# Altium schematic symbol library Semi-ATE.SchLib: 322 symbols (part 2 of 6)
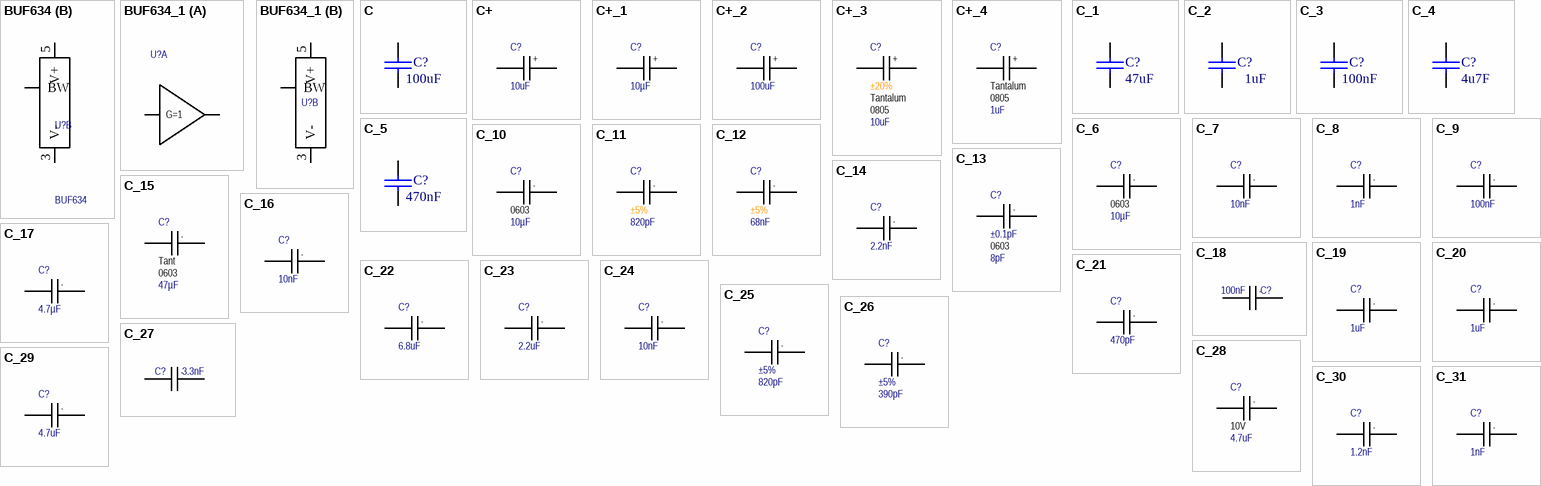
[diagram p20: symbols BUF634 to C_31]

## C_20
designator C?, comment value 1uF  (hidden comment: C)
CAP CER 1UF 16V X5R 0402; 04. Manufacturer: Samsung Electro-Mechanics; 07. Manufacturer  Part Number: CL05A105KO5NNNC; Tolerance: ±10%; 03. Unit Price: 0.09; 13. Created Date/Name: AUG2018/Hören; 3D-Export: No; Voltage Rating: 16V; Type: X5R; ComponentLink1Description: Info; ComponentLink1URL: https://www.digikey.de/product-detail/en/samsung-electro-mechanics/CL05A105KO5NNNC/1276-1067-6-ND/3891581; 02. Distributor Part Number: 1276-1067-6-ND; 09. Operating Temperature: -55°C ~ 85°C; 11. RoHS: YES; 01. Distributor: DigiKey; ComponentLink2Description: DataSheet; ComponentLink2URL: http://www.samsungsem.com/kr/support/product-search/mlcc/__icsFiles/afieldfile/2018/06/19/CL05A105KO5NNNC.pdf; Package: 0402
simulation model CAP (Capacitor)
signal-integrity model Cap
footprint C0201 Reflow (SMT Capacitor 0201 Reflow Soldering)
footprint C0402 Reflow (SMT CAP 0402 Reflow Soldering)
footprint C0603 Reflow (SMT Capacitor 0603 Reflow Soldering)
footprint C0603 Wave (SMT Capacitor 0603 Wave Soldering)
footprint C0805 Reflow (SMT Capacitor 0805 Reflow Soldering)
footprint C0805 Wave (SMT Capacitor 0805 Wave Soldering)
footprint Model Name (Footprint not found)
footprint Model Name (Footprint not found)
footprint C1206 Reflow (SMT Capacitor 1206 Reflow Soldering)
footprint C1206 Wave (SMT Capacitor 1206 Wave Soldering)
footprint C1210 Reflow (SMT Capacitor 1210 Reflow Soldering)
footprint C1210 Wave (SMT Capacitor 1210 Wave Soldering)
footprint C1632 Reflow (SMT Capacitor 1632 Reflow Soldering)
footprint C1632 Wave (SMT Capacitor 1632 Wave Soldering)
footprint C1808 Reflow (SMT Capacitor 1808 Reflow Soldering)
footprint C1808 Wave (SMT Capacitor 1808 Wave Soldering)
footprint C1825 Reflow (SMT Capacitor 1825 Reflow Soldering)
footprint C1825 Wave (SMT Capacitor 1825 Wave Soldering)
footprint C2220 Reflow (SMT Capacitor 2220 Reflow Soldering)
footprint C2220 Wave (SMT Capacitor 2220 Wave Soldering)
footprint C2225 Reflow (SMT Capacitor 2225 Reflow Soldering)
footprint C2225 Wave (SMT Capacitor 2225 Wave Soldering)
pins: 1, 2
text: .

## C_21
designator C?, comment value 470pF  (hidden comment: C)
CAP CER 470PF 16V X7R 0402; 04. Manufacturer: KEMET; 07. Manufacturer  Part Number: C0402C471K4RACTU; Tolerance: ±10%; 03. Unit Price: 0.41; 13. Created Date/Name: AUG2018/Hören; 3D-Export: No; Voltage Rating: 16V; Type: X7R; ComponentLink1Description: Info; ComponentLink1URL: https://www.digikey.de/product-detail/en/kemet/C0402C471K4RACTU/399-7799-6-ND/3472330; 02. Distributor Part Number: 399-7799-6-ND; 09. Operating Temperature: -55°C ~ 125°C; 11. RoHS: YES; 01. Distributor: DigiKey; ComponentLink2Description: DataSheet; Package: 0402
simulation model CAP (Capacitor)
signal-integrity model Cap
footprint C0201 Reflow (SMT Capacitor 0201 Reflow Soldering)
footprint C0402 Reflow (SMT CAP 0402 Reflow Soldering)
footprint C0603 Reflow (SMT Capacitor 0603 Reflow Soldering)
footprint C0603 Wave (SMT Capacitor 0603 Wave Soldering)
footprint C0805 Reflow (SMT Capacitor 0805 Reflow Soldering)
footprint C0805 Wave (SMT Capacitor 0805 Wave Soldering)
footprint Model Name (Footprint not found)
footprint Model Name (Footprint not found)
footprint C1206 Reflow (SMT Capacitor 1206 Reflow Soldering)
footprint C1206 Wave (SMT Capacitor 1206 Wave Soldering)
footprint C1210 Reflow (SMT Capacitor 1210 Reflow Soldering)
footprint C1210 Wave (SMT Capacitor 1210 Wave Soldering)
footprint C1632 Reflow (SMT Capacitor 1632 Reflow Soldering)
footprint C1632 Wave (SMT Capacitor 1632 Wave Soldering)
footprint C1808 Reflow (SMT Capacitor 1808 Reflow Soldering)
footprint C1808 Wave (SMT Capacitor 1808 Wave Soldering)
footprint C1825 Reflow (SMT Capacitor 1825 Reflow Soldering)
footprint C1825 Wave (SMT Capacitor 1825 Wave Soldering)
footprint C2220 Reflow (SMT Capacitor 2220 Reflow Soldering)
footprint C2220 Wave (SMT Capacitor 2220 Wave Soldering)
footprint C2225 Reflow (SMT Capacitor 2225 Reflow Soldering)
footprint C2225 Wave (SMT Capacitor 2225 Wave Soldering)
pins: 1, 2
text: .

## C_22
designator C?, comment value 6.8uF  (hidden comment: C)
CAP CER 6.8UF 25V X5R 0603; 04. Manufacturer: TDK Corporation; 07. Manufacturer  Part Number: C1608X5R1E685K080AC; Tolerance: ±10%; 03. Unit Price: 0.72; 13. Created Date/Name: AUG2018/Hören; 3D-Export: No; Voltage Rating: 25V; Type: X5R; ComponentLink1Description: Info; ComponentLink1URL: https://www.digikey.de/product-detail/en/tdk-corporation/C1608X5R1E685K080AC/445-14145-6-ND/3960241; 02. Distributor Part Number: 445-14145-6-ND; 09. Operating Temperature: -55°C ~ 85°C; 11. RoHS: YES; 01. Distributor: DigiKey; ComponentLink2Description: DataSheet; ComponentLink2URL: https://product.tdk.com/info/en/catalog/datasheets/mlcc_commercial_general_en.pdf; Package: 0603
simulation model CAP (Capacitor)
signal-integrity model Cap
footprint C0201 Reflow (SMT Capacitor 0201 Reflow Soldering)
footprint C0402 Reflow (SMT CAP 0402 Reflow Soldering)
footprint C0603 Reflow (SMT Capacitor 0603 Reflow Soldering)
footprint C0603 Wave (SMT Capacitor 0603 Wave Soldering)
footprint C0805 Reflow (SMT Capacitor 0805 Reflow Soldering)
footprint C0805 Wave (SMT Capacitor 0805 Wave Soldering)
footprint Model Name (Footprint not found)
footprint Model Name (Footprint not found)
footprint C1206 Reflow (SMT Capacitor 1206 Reflow Soldering)
footprint C1206 Wave (SMT Capacitor 1206 Wave Soldering)
footprint C1210 Reflow (SMT Capacitor 1210 Reflow Soldering)
footprint C1210 Wave (SMT Capacitor 1210 Wave Soldering)
footprint C1632 Reflow (SMT Capacitor 1632 Reflow Soldering)
footprint C1632 Wave (SMT Capacitor 1632 Wave Soldering)
footprint C1808 Reflow (SMT Capacitor 1808 Reflow Soldering)
footprint C1808 Wave (SMT Capacitor 1808 Wave Soldering)
footprint C1825 Reflow (SMT Capacitor 1825 Reflow Soldering)
footprint C1825 Wave (SMT Capacitor 1825 Wave Soldering)
footprint C2220 Reflow (SMT Capacitor 2220 Reflow Soldering)
footprint C2220 Wave (SMT Capacitor 2220 Wave Soldering)
footprint C2225 Reflow (SMT Capacitor 2225 Reflow Soldering)
footprint C2225 Wave (SMT Capacitor 2225 Wave Soldering)
pins: 1, 2
text: .

## C_23
designator C?, comment value 2.2uF  (hidden comment: C)
CAP CER 2.2UF 25V X5R 0402; 04. Manufacturer: TDK Corporation; 07. Manufacturer  Part Number: C1005X5R1E225K050BC; Tolerance: ±10%; 03. Unit Price: 0.35; 13. Created Date/Name: AUG2018/Hören; 3D-Export: No; Voltage Rating: 25V; Type: X5R; ComponentLink1Description: Info; ComponentLink1URL: https://www.digikey.de/product-detail/en/tdk-corporation/C1005X5R1E225K050BC/445-9090-6-ND/3661611; 02. Distributor Part Number: 445-9090-6-ND; 09. Operating Temperature: -55°C ~ 85°C; 11. RoHS: YES; 01. Distributor: DigiKey; ComponentLink2Description: DataSheet; ComponentLink2URL: https://product.tdk.com/info/en/catalog/datasheets/mlcc_commercial_general_en.pdf; Package: 0402
simulation model CAP (Capacitor)
signal-integrity model Cap
footprint C0201 Reflow (SMT Capacitor 0201 Reflow Soldering)
footprint C0402 Reflow (SMT CAP 0402 Reflow Soldering)
footprint C0603 Reflow (SMT Capacitor 0603 Reflow Soldering)
footprint C0603 Wave (SMT Capacitor 0603 Wave Soldering)
footprint C0805 Reflow (SMT Capacitor 0805 Reflow Soldering)
footprint C0805 Wave (SMT Capacitor 0805 Wave Soldering)
footprint Model Name (Footprint not found)
footprint Model Name (Footprint not found)
footprint C1206 Reflow (SMT Capacitor 1206 Reflow Soldering)
footprint C1206 Wave (SMT Capacitor 1206 Wave Soldering)
footprint C1210 Reflow (SMT Capacitor 1210 Reflow Soldering)
footprint C1210 Wave (SMT Capacitor 1210 Wave Soldering)
footprint C1632 Reflow (SMT Capacitor 1632 Reflow Soldering)
footprint C1632 Wave (SMT Capacitor 1632 Wave Soldering)
footprint C1808 Reflow (SMT Capacitor 1808 Reflow Soldering)
footprint C1808 Wave (SMT Capacitor 1808 Wave Soldering)
footprint C1825 Reflow (SMT Capacitor 1825 Reflow Soldering)
footprint C1825 Wave (SMT Capacitor 1825 Wave Soldering)
footprint C2220 Reflow (SMT Capacitor 2220 Reflow Soldering)
footprint C2220 Wave (SMT Capacitor 2220 Wave Soldering)
footprint C2225 Reflow (SMT Capacitor 2225 Reflow Soldering)
footprint C2225 Wave (SMT Capacitor 2225 Wave Soldering)
pins: 1, 2
text: .

## C_24
designator C?, comment value 10nF  (hidden comment: C)
CAP CER 10000PF 25V X7R 0402; 04. Manufacturer: 311-1337-6-ND; 07. Manufacturer  Part Number: CC0402KRX7R8BB103; Tolerance: ±10%; 03. Unit Price: 0.09; 13. Created Date/Name: AUG2018/Hören; 3D-Export: No; Voltage Rating: 25V; Type: X7R; ComponentLink1Description: Info; ComponentLink1URL: https://www.digikey.de/product-detail/en/yageo/CC0402KRX7R8BB103/311-1337-6-ND/2103167; 02. Distributor Part Number: 311-1337-6-ND; 09. Operating Temperature: -55°C ~ 125°C; 11. RoHS: YES; 01. Distributor: DigiKey; ComponentLink2Description: DataSheet; ComponentLink2URL: http://www.yageo.com/documents/recent/UPY-GPHC_X7R_6.3V-to-50V_18.pdf; Package: 0402
simulation model CAP (Capacitor)
signal-integrity model Cap
footprint C0201 Reflow (SMT Capacitor 0201 Reflow Soldering)
footprint C0402 Reflow (SMT CAP 0402 Reflow Soldering)
footprint C0603 Reflow (SMT Capacitor 0603 Reflow Soldering)
footprint C0603 Wave (SMT Capacitor 0603 Wave Soldering)
footprint C0805 Reflow (SMT Capacitor 0805 Reflow Soldering)
footprint C0805 Wave (SMT Capacitor 0805 Wave Soldering)
footprint Model Name (Footprint not found)
footprint Model Name (Footprint not found)
footprint C1206 Reflow (SMT Capacitor 1206 Reflow Soldering)
footprint C1206 Wave (SMT Capacitor 1206 Wave Soldering)
footprint C1210 Reflow (SMT Capacitor 1210 Reflow Soldering)
footprint C1210 Wave (SMT Capacitor 1210 Wave Soldering)
footprint C1632 Reflow (SMT Capacitor 1632 Reflow Soldering)
footprint C1632 Wave (SMT Capacitor 1632 Wave Soldering)
footprint C1808 Reflow (SMT Capacitor 1808 Reflow Soldering)
footprint C1808 Wave (SMT Capacitor 1808 Wave Soldering)
footprint C1825 Reflow (SMT Capacitor 1825 Reflow Soldering)
footprint C1825 Wave (SMT Capacitor 1825 Wave Soldering)
footprint C2220 Reflow (SMT Capacitor 2220 Reflow Soldering)
footprint C2220 Wave (SMT Capacitor 2220 Wave Soldering)
footprint C2225 Reflow (SMT Capacitor 2225 Reflow Soldering)
footprint C2225 Wave (SMT Capacitor 2225 Wave Soldering)
pins: 1, 2
text: .

## C_25
designator C?, comment value 820pF  Tolerance: ±5%  (hidden comment: C)
CAP CER 820PF 50V C0G 0402; 04. Manufacturer: TDK Corporation; 07. Manufacturer  Part Number: CGA2B2C0G1H821J050BA; Type: C0G, NP0; 03. Unit Price: 0.14; 13. Created Date/Name: AUG2018/Hören; 3D-Export: No; Voltage Rating: 50V; ComponentLink1Description: Info; ComponentLink1URL: https://www.digikey.de/products/en?keywords=445-6884-1-ND; 02. Distributor Part Number: 445-6884-1-ND; 09. Operating Temperature: -55°C ~ 125°C; 11. RoHS: YES; 01. Distributor: DigiKey; ComponentLink2Description: DataSheet; ComponentLink2URL: https://product.tdk.com/info/en/catalog/datasheets/mlcc_automotive_general_en.pdf; Package: 0402
simulation model CAP (Capacitor)
signal-integrity model Cap
footprint C0201 Reflow (SMT Capacitor 0201 Reflow Soldering)
footprint C0402 Reflow (SMT CAP 0402 Reflow Soldering)
footprint C0603 Reflow (SMT Capacitor 0603 Reflow Soldering)
footprint C0603 Wave (SMT Capacitor 0603 Wave Soldering)
footprint C0805 Reflow (SMT Capacitor 0805 Reflow Soldering)
footprint C0805 Wave (SMT Capacitor 0805 Wave Soldering)
footprint Model Name (Footprint not found)
footprint Model Name (Footprint not found)
footprint C1206 Reflow (SMT Capacitor 1206 Reflow Soldering)
footprint C1206 Wave (SMT Capacitor 1206 Wave Soldering)
footprint C1210 Reflow (SMT Capacitor 1210 Reflow Soldering)
footprint C1210 Wave (SMT Capacitor 1210 Wave Soldering)
footprint C1632 Reflow (SMT Capacitor 1632 Reflow Soldering)
footprint C1632 Wave (SMT Capacitor 1632 Wave Soldering)
footprint C1808 Reflow (SMT Capacitor 1808 Reflow Soldering)
footprint C1808 Wave (SMT Capacitor 1808 Wave Soldering)
footprint C1825 Reflow (SMT Capacitor 1825 Reflow Soldering)
footprint C1825 Wave (SMT Capacitor 1825 Wave Soldering)
footprint C2220 Reflow (SMT Capacitor 2220 Reflow Soldering)
footprint C2220 Wave (SMT Capacitor 2220 Wave Soldering)
footprint C2225 Reflow (SMT Capacitor 2225 Reflow Soldering)
footprint C2225 Wave (SMT Capacitor 2225 Wave Soldering)
pins: 1, 2
text: .

## C_26
designator C?, comment value 390pF  Tolerance: ±5%  (hidden comment: C)
CAP CER 390PF 50V C0G 0402; 04. Manufacturer: TDK Corporation; 07. Manufacturer  Part Number: CGA2B2C0G1H391J050BA; Type: C0G, NP0; 03. Unit Price: 0.09; 13. Created Date/Name: AUG2018/Hören; 3D-Export: No; Voltage Rating: 50V; ComponentLink1Description: Info; ComponentLink1URL: https://www.digikey.de/products/en?keywords=445-5603-1-ND; 02. Distributor Part Number: 445-5603-1-ND; 09. Operating Temperature: -55°C ~ 125°C; 11. RoHS: YES; 01. Distributor: DigiKey; ComponentLink2Description: DataSheet; ComponentLink2URL: https://product.tdk.com/info/en/catalog/datasheets/mlcc_automotive_general_en.pdf; Package: 0402
simulation model CAP (Capacitor)
signal-integrity model Cap
footprint C0201 Reflow (SMT Capacitor 0201 Reflow Soldering)
footprint C0402 Reflow (SMT CAP 0402 Reflow Soldering)
footprint C0603 Reflow (SMT Capacitor 0603 Reflow Soldering)
footprint C0603 Wave (SMT Capacitor 0603 Wave Soldering)
footprint C0805 Reflow (SMT Capacitor 0805 Reflow Soldering)
footprint C0805 Wave (SMT Capacitor 0805 Wave Soldering)
footprint Model Name (Footprint not found)
footprint Model Name (Footprint not found)
footprint C1206 Reflow (SMT Capacitor 1206 Reflow Soldering)
footprint C1206 Wave (SMT Capacitor 1206 Wave Soldering)
footprint C1210 Reflow (SMT Capacitor 1210 Reflow Soldering)
footprint C1210 Wave (SMT Capacitor 1210 Wave Soldering)
footprint C1632 Reflow (SMT Capacitor 1632 Reflow Soldering)
footprint C1632 Wave (SMT Capacitor 1632 Wave Soldering)
footprint C1808 Reflow (SMT Capacitor 1808 Reflow Soldering)
footprint C1808 Wave (SMT Capacitor 1808 Wave Soldering)
footprint C1825 Reflow (SMT Capacitor 1825 Reflow Soldering)
footprint C1825 Wave (SMT Capacitor 1825 Wave Soldering)
footprint C2220 Reflow (SMT Capacitor 2220 Reflow Soldering)
footprint C2220 Wave (SMT Capacitor 2220 Wave Soldering)
footprint C2225 Reflow (SMT Capacitor 2225 Reflow Soldering)
footprint C2225 Wave (SMT Capacitor 2225 Wave Soldering)
pins: 1, 2
text: .

## C_27
designator C?, comment value 3.3nF  (hidden comment: C)
CAP CER 3300PF 100V X8R 0402; 04. Manufacturer: TDK Corporation; 07. Manufacturer  Part Number: C1005X8R2A332K050BB; Tolerance: ±10%; 03. Unit Price: 0.22; 13. Created Date/Name: AUG2018/Hören; 3D-Export: No; Voltage Rating: 100V; Type: X8R; ComponentLink1Description: Info; ComponentLink1URL: https://www.digikey.de/products/en?keywords=445-15917-1-ND; 02. Distributor Part Number: 445-15917-1-ND; 09. Operating Temperature: -55°C ~ 150°C; 11. RoHS: YES; 01. Distributor: DigiKey; ComponentLink2Description: DataSheet; ComponentLink2URL: https://product.tdk.com/info/en/catalog/datasheets/mlcc_commercial_hightemp_en.pdf; Package: 0402
simulation model CAP (Capacitor)
signal-integrity model Cap
footprint C0201 Reflow (SMT Capacitor 0201 Reflow Soldering)
footprint C0402 Reflow (SMT CAP 0402 Reflow Soldering)
footprint C0603 Reflow (SMT Capacitor 0603 Reflow Soldering)
footprint C0603 Wave (SMT Capacitor 0603 Wave Soldering)
footprint C0805 Reflow (SMT Capacitor 0805 Reflow Soldering)
footprint C0805 Wave (SMT Capacitor 0805 Wave Soldering)
footprint Model Name (Footprint not found)
footprint Model Name (Footprint not found)
footprint C1206 Reflow (SMT Capacitor 1206 Reflow Soldering)
footprint C1206 Wave (SMT Capacitor 1206 Wave Soldering)
footprint C1210 Reflow (SMT Capacitor 1210 Reflow Soldering)
footprint C1210 Wave (SMT Capacitor 1210 Wave Soldering)
footprint C1632 Reflow (SMT Capacitor 1632 Reflow Soldering)
footprint C1632 Wave (SMT Capacitor 1632 Wave Soldering)
footprint C1808 Reflow (SMT Capacitor 1808 Reflow Soldering)
footprint C1808 Wave (SMT Capacitor 1808 Wave Soldering)
footprint C1825 Reflow (SMT Capacitor 1825 Reflow Soldering)
footprint C1825 Wave (SMT Capacitor 1825 Wave Soldering)
footprint C2220 Reflow (SMT Capacitor 2220 Reflow Soldering)
footprint C2220 Wave (SMT Capacitor 2220 Wave Soldering)
footprint C2225 Reflow (SMT Capacitor 2225 Reflow Soldering)
footprint C2225 Wave (SMT Capacitor 2225 Wave Soldering)
pins: 1, 2
text: .

## C_28
designator C?, comment value 4.7uF  Voltage Rating: 10V  (hidden comment: C)
CAP CER 4.7UF 10V X5R 0402; 04. Manufacturer: Samsung Electro-Mechanics; 07. Manufacturer  Part Number: CL05A475KP5NRNC; Tolerance: ±10%; 03. Unit Price: 0.37; 13. Created Date/Name: AUG2018/Hören; 3D-Export: No; Type: X5R; ComponentLink1Description: Info; ComponentLink1URL: https://www.digikey.de/product-detail/en/samsung-electro-mechanics/CL05A475KP5NRNC/1276-1480-6-ND/3891994; 02. Distributor Part Number: 1276-1480-6-ND; 09. Operating Temperature: -55°C ~ 85°C; 11. RoHS: YES; 01. Distributor: DigiKey; ComponentLink2Description: DataSheet; ComponentLink2URL: https://media.digikey.com/pdf/Data%20Sheets/Samsung%20PDFs/CL_Series_MLCC_ds.pdf; Package: 0402
simulation model CAP (Capacitor)
signal-integrity model Cap
footprint C0201 Reflow (SMT Capacitor 0201 Reflow Soldering)
footprint C0402 Reflow (SMT CAP 0402 Reflow Soldering)
footprint C0603 Reflow (SMT Capacitor 0603 Reflow Soldering)
footprint C0603 Wave (SMT Capacitor 0603 Wave Soldering)
footprint C0805 Reflow (SMT Capacitor 0805 Reflow Soldering)
footprint C0805 Wave (SMT Capacitor 0805 Wave Soldering)
footprint Model Name (Footprint not found)
footprint Model Name (Footprint not found)
footprint C1206 Reflow (SMT Capacitor 1206 Reflow Soldering)
footprint C1206 Wave (SMT Capacitor 1206 Wave Soldering)
footprint C1210 Reflow (SMT Capacitor 1210 Reflow Soldering)
footprint C1210 Wave (SMT Capacitor 1210 Wave Soldering)
footprint C1632 Reflow (SMT Capacitor 1632 Reflow Soldering)
footprint C1632 Wave (SMT Capacitor 1632 Wave Soldering)
footprint C1808 Reflow (SMT Capacitor 1808 Reflow Soldering)
footprint C1808 Wave (SMT Capacitor 1808 Wave Soldering)
footprint C1825 Reflow (SMT Capacitor 1825 Reflow Soldering)
footprint C1825 Wave (SMT Capacitor 1825 Wave Soldering)
footprint C2220 Reflow (SMT Capacitor 2220 Reflow Soldering)
footprint C2220 Wave (SMT Capacitor 2220 Wave Soldering)
footprint C2225 Reflow (SMT Capacitor 2225 Reflow Soldering)
footprint C2225 Wave (SMT Capacitor 2225 Wave Soldering)
pins: 1, 2
text: .

## C_29
designator C?, comment value 4.7uF  (hidden comment: C)
CAP CER 4.7UF 50V X7R 0805; 04. Manufacturer: TDK Corporation; 07. Manufacturer  Part Number: CGA4J1X7R1H475K125AE; Tolerance: ±10%; 03. Unit Price: 0.67; 13. Created Date/Name: AUG2018/Hören; 3D-Export: No; Voltage Rating: 50V; Type: X7R; ComponentLink1Description: Info; ComponentLink1URL: https://www.digikey.de/product-detail/en/tdk-corporation/CGA4J1X7R1H475K125AE/445-181410-6-ND/9744782; 02. Distributor Part Number: 445-181410-6-ND; 09. Operating Temperature: -55°C ~ 125°C; 11. RoHS: YES; 01. Distributor: DigiKey; ComponentLink2Description: DataSheet; Package: 0805
simulation model CAP (Capacitor)
signal-integrity model Cap
footprint C0201 Reflow (SMT Capacitor 0201 Reflow Soldering)
footprint C0402 Reflow (SMT CAP 0402 Reflow Soldering)
footprint C0603 Reflow (SMT Capacitor 0603 Reflow Soldering)
footprint C0603 Wave (SMT Capacitor 0603 Wave Soldering)
footprint C0805 Reflow (SMT Capacitor 0805 Reflow Soldering)
footprint C0805 Wave (SMT Capacitor 0805 Wave Soldering)
footprint Model Name (Footprint not found)
footprint Model Name (Footprint not found)
footprint C1206 Reflow (SMT Capacitor 1206 Reflow Soldering)
footprint C1206 Wave (SMT Capacitor 1206 Wave Soldering)
footprint C1210 Reflow (SMT Capacitor 1210 Reflow Soldering)
footprint C1210 Wave (SMT Capacitor 1210 Wave Soldering)
footprint C1632 Reflow (SMT Capacitor 1632 Reflow Soldering)
footprint C1632 Wave (SMT Capacitor 1632 Wave Soldering)
footprint C1808 Reflow (SMT Capacitor 1808 Reflow Soldering)
footprint C1808 Wave (SMT Capacitor 1808 Wave Soldering)
footprint C1825 Reflow (SMT Capacitor 1825 Reflow Soldering)
footprint C1825 Wave (SMT Capacitor 1825 Wave Soldering)
footprint C2220 Reflow (SMT Capacitor 2220 Reflow Soldering)
footprint C2220 Wave (SMT Capacitor 2220 Wave Soldering)
footprint C2225 Reflow (SMT Capacitor 2225 Reflow Soldering)
footprint C2225 Wave (SMT Capacitor 2225 Wave Soldering)
pins: 1, 2
text: .

## C_30
designator C?, comment value 1.2nF  (hidden comment: C)
CAP CER 1200PF 50V X7R 0402; 04. Manufacturer: Samsung Electro-Mechanics; 07. Manufacturer  Part Number: CL05B122KB5NNNC; Tolerance: ±10%; 03. Unit Price: 0.09; 13. Created Date/Name: AUG2018/Hören; 3D-Export: No; Voltage Rating: 50V; Type: X7R; ComponentLink1Description: Info; ComponentLink1URL: https://www.digikey.de/product-detail/en/samsung-electro-mechanics/CL05B122KB5NNNC/1276-1515-6-ND/3892029; 02. Distributor Part Number: 1276-1515-6-ND; 09. Operating Temperature: -55°C ~ 125°C; 11. RoHS: YES; 01. Distributor: DigiKey; ComponentLink2Description: DataSheet; ComponentLink2URL: http://www.samsungsem.com/kr/support/product-search/mlcc/CL05B122KB5NNNC.jsp; Package: 0402; ClassName: A
simulation model CAP (Capacitor)
signal-integrity model Cap
footprint C0201 Reflow (SMT Capacitor 0201 Reflow Soldering)
footprint C0402 Reflow (SMT CAP 0402 Reflow Soldering)
footprint C0603 Reflow (SMT Capacitor 0603 Reflow Soldering)
footprint C0603 Wave (SMT Capacitor 0603 Wave Soldering)
footprint C0805 Reflow (SMT Capacitor 0805 Reflow Soldering)
footprint C0805 Wave (SMT Capacitor 0805 Wave Soldering)
footprint Model Name (Footprint not found)
footprint Model Name (Footprint not found)
footprint C1206 Reflow (SMT Capacitor 1206 Reflow Soldering)
footprint C1206 Wave (SMT Capacitor 1206 Wave Soldering)
footprint C1210 Reflow (SMT Capacitor 1210 Reflow Soldering)
footprint C1210 Wave (SMT Capacitor 1210 Wave Soldering)
footprint C1632 Reflow (SMT Capacitor 1632 Reflow Soldering)
footprint C1632 Wave (SMT Capacitor 1632 Wave Soldering)
footprint C1808 Reflow (SMT Capacitor 1808 Reflow Soldering)
footprint C1808 Wave (SMT Capacitor 1808 Wave Soldering)
footprint C1825 Reflow (SMT Capacitor 1825 Reflow Soldering)
footprint C1825 Wave (SMT Capacitor 1825 Wave Soldering)
footprint C2220 Reflow (SMT Capacitor 2220 Reflow Soldering)
footprint C2220 Wave (SMT Capacitor 2220 Wave Soldering)
footprint C2225 Reflow (SMT Capacitor 2225 Reflow Soldering)
footprint C2225 Wave (SMT Capacitor 2225 Wave Soldering)
pins: 1, 2
text: .

## C_31
designator C?, comment value 1nF  (hidden comment: C)
CAP CER 1000PF 50V X7R 0402; 04. Manufacturer: Murata Electronics North America; 07. Manufacturer  Part Number: GCM155R71H102KA37D; Tolerance: ±10%; 03. Unit Price: 0.09; 13. Created Date/Name: AUG2018/Hören; 3D-Export: No; Voltage Rating: 50V; Type: X7R; ComponentLink1Description: Info; ComponentLink1URL: https://www.digikey.de/product-detail/en/murata-electronics-north-america/GCM155R71H102KA37D/490-4761-6-ND/1641725; 02. Distributor Part Number: 490-4761-6-ND; 09. Operating Temperature: -55°C ~ 125°C; 11. RoHS: YES; 01. Distributor: DigiKey; ComponentLink2Description: DataSheet; ComponentLink2URL: https://psearch.en.murata.com/capacitor/product/GCM155R71H102KA37%23.pdf; Package: 0402; ClassName: A
simulation model CAP (Capacitor)
signal-integrity model Cap
footprint C0201 Reflow (SMT Capacitor 0201 Reflow Soldering)
footprint C0402 Reflow (SMT CAP 0402 Reflow Soldering)
footprint C0603 Reflow (SMT Capacitor 0603 Reflow Soldering)
footprint C0603 Wave (SMT Capacitor 0603 Wave Soldering)
footprint C0805 Reflow (SMT Capacitor 0805 Reflow Soldering)
footprint C0805 Wave (SMT Capacitor 0805 Wave Soldering)
footprint Model Name (Footprint not found)
footprint Model Name (Footprint not found)
footprint C1206 Reflow (SMT Capacitor 1206 Reflow Soldering)
footprint C1206 Wave (SMT Capacitor 1206 Wave Soldering)
footprint C1210 Reflow (SMT Capacitor 1210 Reflow Soldering)
footprint C1210 Wave (SMT Capacitor 1210 Wave Soldering)
footprint C1632 Reflow (SMT Capacitor 1632 Reflow Soldering)
footprint C1632 Wave (SMT Capacitor 1632 Wave Soldering)
footprint C1808 Reflow (SMT Capacitor 1808 Reflow Soldering)
footprint C1808 Wave (SMT Capacitor 1808 Wave Soldering)
footprint C1825 Reflow (SMT Capacitor 1825 Reflow Soldering)
footprint C1825 Wave (SMT Capacitor 1825 Wave Soldering)
footprint C2220 Reflow (SMT Capacitor 2220 Reflow Soldering)
footprint C2220 Wave (SMT Capacitor 2220 Wave Soldering)
footprint C2225 Reflow (SMT Capacitor 2225 Reflow Soldering)
footprint C2225 Wave (SMT Capacitor 2225 Wave Soldering)
pins: 1, 2
text: .

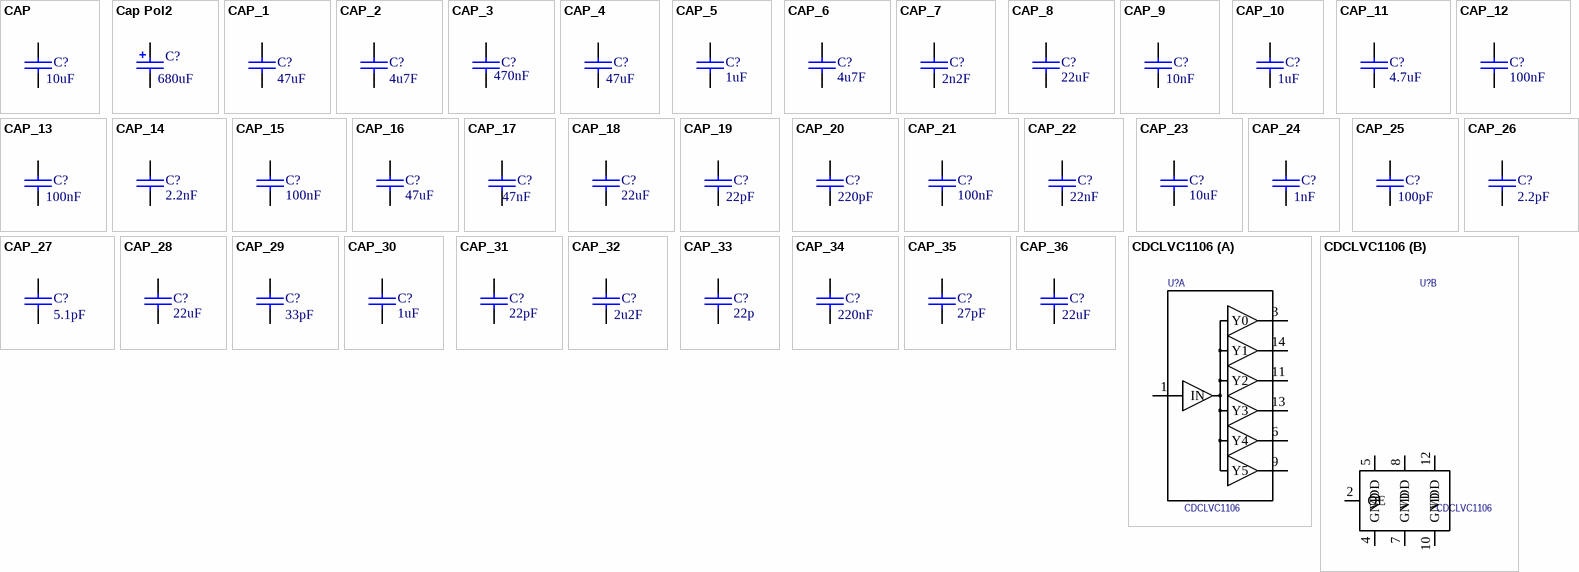
[diagram p6: symbols CAP to CDCLVC1106]

## CAP
designator C?, comment value 10uF  (hidden comment: C)
CAP CER 10UF 10V X7R 0805; 04. Manufacturer: Samsung Electro-Mechanics; 07. Manufacturer  Part Number: CL21B106KPQNNNE; POPULATED: yes; Parameters: X7R, 10V, 10%; 03. Unit Price: 0.26; Tolerance: 10%; 3D-Export: No; Temperature Range: -40°C/+85°C; 01. Distributor: DigiKey; 02. Distributor Part Number: 1276-1764-6-ND; 09. Operating Temperature: -55°C ~ 125°C; 11. RoHS: YES; Type: X7R; Voltage Rating: 10V
footprint C0402 (Chip Capacitor; Body 1.0x0.5mm (LxW typ), IPC High Density)
footprint C0603 (Chip Capacitor; Body 1.6x0.8mm (LxW typ), IPC High Density)
footprint C0805 (Chip Capacitor; Body 2.0x1.3mm (LxW typ), IPC High Density)
footprint C1206 (Chip Capacitor; Body 3.2x1.6mm (LxW typ), IPC High Density)
footprint C1210 (Chip Capacitor; Body 3.2x2.5mm (LxW typ), IPC High Density)
footprint C1812 (Chip Capacitor; Body 4.5x3.2mm (LxW typ), IPC High Density)
footprint C1825 (Chip Capacitor; Body 4.5x6.4mm (LxW typ), IPC High Density)
signal-integrity model Cap
simulation model CAP
footprint C0805 Reflow
pins: 1, 2
2 alternate drawings of the same symbol

## Cap Pol2
designator C?, comment value 680uF  (hidden comment: C+)
CAP TANT 680UF 10% 4V 2917; MFR-PN: TPME687K004R0023; MFR: AVX; 04. Manufacturer: AVX Corporation; POPULATED: yes; Parameters: Tantalum, 4V, ±10%; 03. Unit Price: 5.63; Type: Tantalum; 3D-Export: No; Temperature Range: -55°C ~ 125°C; 01. Distributor: DigiKey; 02. Distributor Part Number: 478-1815-6-ND; 07. Manufacturer  Part Number: TPME687K004R0023; 09. Operating Temperature: -55°C ~ 125°C; Tolerance: ±10%; Voltage Rating: 4V; ComponentLink4Description: Info; ComponentLink4URL: https://www.digikey.de/products/en/capacitors/tantalum-capacitors/59?k=TPME687K004R0023&k=&pkeyword=TPME687K004R0023&sv=0&pv7=243&sf=0&quantity=&ColumnSort=0&page=1&pageSize=25; ComponentLink5Description: DataSheet; ComponentLink5URL: http://datasheets.avx.com/TPM.pdf
footprint 7343-43(E) (Molded Tantal)
signal-integrity model Cap
simulation model CAP
pins: 1, 2
2 alternate drawings of the same symbol

## CAP_1
designator C?, comment value 47uF  (hidden comment: C)
CAP CER 47UF 10V X5R 0805; MFR-PN: GRM32ER71A476KE15L; MFR: MURATA; MFR-TYPE: GRM series; 04. Manufacturer: Murata Electronics North America; 07. Manufacturer  Part Number: GRM21BR61A476ME15L; POPULATED: yes; Parameters: X7R, 10V, 10%; 03. Unit Price: 0.67; Tolerance: ±20%; Type: X7R; 3D-Export: No; Temperature Range: -55°C ~ 85°C; 01. Distributor: DigiKey; 02. Distributor Part Number: 490-9961-6-ND; 09. Operating Temperature: -55°C ~ 85°C; 11. RoHS: YES; Voltage Rating: 10V; ComponentLink4Description: Info; ComponentLink4URL: https://www.digikey.de/product-detail/en/murata-electronics-north-america/GRM21BR61A476ME15L/490-9961-6-ND/5027050; ComponentLink5Description: DataSheet; ComponentLink5URL: https://search.murata.co.jp/Ceramy/image/img/A01X/G101/ENG/GRM21BR61A476ME15-01.pdf
footprint C0805 (Chip Capacitor; Body 2.0x1.3mm (LxW typ), IPC High Density)
footprint C0805-1.45
signal-integrity model Cap
simulation model CAP
footprint C1210
footprint C0805 Reflow
pins: 1, 2
2 alternate drawings of the same symbol

## CAP_2
designator C?, comment value 4u7F  (hidden comment: C)
CAP CER 4.7UF 6.3V X5R 0402; 04. Manufacturer: Samsung Electro-Mechanics; 07. Manufacturer  Part Number: CL05A475KQ5NRNC; POPULATED: yes; Parameters: X7R, 6V3, 10%; 03. Unit Price: 0.28; Tolerance: 10%; Type: X7R; Voltage Rating: 6V3; 3D-Export: No; Temperature Range: -40°C/+85°C; 01. Distributor: DigiKey; 02. Distributor Part Number: 1276-1481-6-ND; 09. Operating Temperature: -55°C ~ 85°C; 11. RoHS: YES; ComponentLink4Description: DataSheet; ComponentLink4URL: https://media.digikey.com/pdf/Data%20Sheets/Samsung%20PDFs/CL_Series_MLCC_ds.pdf; ComponentLink5Description: Info; ComponentLink5URL: https://www.digikey.de/product-detail/en/samsung-electro-mechanics/CL05A475KQ5NRNC/1276-1481-6-ND/3891995
footprint C0402 (Chip Capacitor; Body 1.0x0.5mm (LxW typ), IPC High Density)
signal-integrity model Cap
simulation model CAP
footprint C0805
footprint C0402 RevOne
pins: 1, 2
2 alternate drawings of the same symbol

## CAP_3
designator C?, comment value 470nF  (hidden comment: C)
CAP CER 0.47UF 10V X5R 0402; 04. Manufacturer: Samsung Electro-Mechanics; 07. Manufacturer  Part Number: CL05A474KP5NNNC; POPULATED: yes; Parameters: X5R, 10V, 10%; 03. Unit Price: 0.09; Tolerance: 10%; 3D-Export: No; Temperature Range: -55°C ~ 85°C; 01. Distributor: DigiKey; 02. Distributor Part Number: 1276-1173-6-ND; 09. Operating Temperature: -55°C ~ 85°C; 11. RoHS: YES; Type: X5R; Voltage Rating: 10V; ComponentLink4Description: Info; ComponentLink4URL: https://www.digikey.de/product-detail/en/samsung-electro-mechanics/CL05A474KP5NNNC/1276-1173-6-ND/3891687; ComponentLink5Description: DataSheet; ComponentLink5URL: https://media.digikey.com/pdf/Data%20Sheets/Samsung%20PDFs/CL_Series_MLCC_ds.pdf
footprint C0402 (Chip Capacitor; Body 1.0x0.5mm (LxW typ), IPC High Density)
signal-integrity model Cap
simulation model CAP
footprint C0402 RevOne
pins: 1, 2
2 alternate drawings of the same symbol

## CAP_4
designator C?, comment value 47uF  (hidden comment: C)
CAP CER 47UF 10V X5R 1206; MFR-PN: GRM32ER71A476KE15L; MFR: MURATA; MFR-TYPE: GRM series; 04. Manufacturer: Samsung Electro-Mechanics; 07. Manufacturer  Part Number: CL31A476MPHNNNE; POPULATED: yes; Parameters: X7R, 10V, 10%; 03. Unit Price: 0.64; Tolerance: ±20%; Type: X7R; 3D-Export: No; Temperature Range: -55°C ~ 85°C; 01. Distributor: DigiKey; 02. Distributor Part Number: 1276-3063-6-ND; 09. Operating Temperature: -55°C ~ 85°C; 11. RoHS: YES; ComponentLink1Description: Info; ComponentLink1URL: https://www.digikey.de/product-detail/en/murata-electronics-north-america/GRM32EC70J107ME15L/490-10530-6-ND/5027076; Voltage Rating: 10V; ComponentLink4Description: Info; ComponentLink4URL: https://www.digikey.de/product-detail/en/samsung-electro-mechanics/CL31A476MPHNNNE/1276-3063-6-ND/3893578; ComponentLink5Description: DataSheet; ComponentLink5URL: https://media.digikey.com/pdf/Data%20Sheets/Samsung%20PDFs/CL_Series_MLCC_ds.pdf
footprint C1206 (Chip Capacitor; Body 3.2x1.6mm (LxW typ), IPC High Density)
footprint C1206-2.7
signal-integrity model Cap
simulation model CAP
footprint C1210
footprint C1206 Reflow
pins: 1, 2
2 alternate drawings of the same symbol

## CAP_5
designator C?, comment value 1uF  (hidden comment: C)
CAP CER 1UF 10V X7R 0603; 04. Manufacturer: Samsung Electro-Mechanics; 07. Manufacturer  Part Number: CL10B105KP8NNNC; Parameters: X7R, 10V, 10%; POPULATED: yes; 03. Unit Price: 0.09; Tolerance: 10%; 3D-Export: No; 01. Distributor: DigiKey; 02. Distributor Part Number: 1276-1946-6-ND; 09. Operating Temperature: -55°C ~ 125°C; 11. RoHS: YES; Temperature Range: -40°C/+85°C; Type: X7R; Voltage Rating: 10V; ComponentLink4Description: Info; ComponentLink4URL: https://www.digikey.de/product-detail/en/samsung-electro-mechanics/CL10B105KP8NNNC/1276-1946-6-ND/3892460; ComponentLink5Description: DataSheet; ComponentLink5URL: https://media.digikey.com/pdf/Data%20Sheets/Samsung%20PDFs/CL_Series_MLCC_ds.pdf
footprint C0603 (Chip Capacitor; Body 1.6x0.8mm (LxW typ), IPC High Density)
signal-integrity model Cap
simulation model CAP
footprint C0603 Reflow
pins: 1, 2
2 alternate drawings of the same symbol

## CAP_6
designator C?, comment value 4u7F  (hidden comment: C)
CAP CER 4.7UF 6.3V X7R 0805; 04. Manufacturer: Samsung Electro-Mechanics; 07. Manufacturer  Part Number: CL21B475KQQNNNE; Parameters: X7R, 6V3, 10%; POPULATED: yes; 03. Unit Price: 0.2; Tolerance: 10%; Voltage Rating: 6V3; 3D-Export: No; 01. Distributor: DigiKey; 02. Distributor Part Number: 1276-2974-6-ND; 09. Operating Temperature: -55°C ~ 125°C; 11. RoHS: YES; Temperature Range: -40°C/+85°C; Type: X7R; ComponentLink4Description: DataSheet; ComponentLink4URL: http://www.samsungsem.com/kr/support/product-search/mlcc/__icsFiles/afieldfile/2018/07/24/CL21B475KQQNNNE.pdf; ComponentLink5Description: Info; ComponentLink5URL: https://www.digikey.de/product-detail/en/samsung-electro-mechanics/CL21B475KQQNNNE/1276-2974-6-ND/3893489
footprint C0805 (Chip Capacitor; Body 2.0x1.3mm (LxW typ), IPC High Density)
signal-integrity model Cap
simulation model CAP
footprint C0805 Reflow
pins: 1, 2
2 alternate drawings of the same symbol

## CAP_7
designator C?, comment value 2n2F  (hidden comment: C)
CAP CER 2200PF 16V X7R 0402; 04. Manufacturer: Yageo; 07. Manufacturer  Part Number: CC0402KRX7R7BB222; POPULATED: yes; Parameters: X7R, 16V, 10%; 03. Unit Price: 0.09; Tolerance: 10%; 3D-Export: No; 01. Distributor: DigiKey; 02. Distributor Part Number: 311-1707-6-ND; 09. Operating Temperature: -55°C ~ 125°C; 11. RoHS: YES; Temperature Range: -40°C/+85°C; Type: X7R; Voltage Rating: 16V; ComponentLink4Description: Info; ComponentLink4URL: https://www.digikey.de/product-detail/en/yageo/CC0402KRX7R7BB222/311-1707-6-ND/5196105; ComponentLink5Description: DataSheet; ComponentLink5URL: http://www.yageo.com/documents/recent/UPY-GPHC_X7R_6.3V-to-50V_18.pdf
footprint C0603 (Chip Capacitor; Body 1.6x0.8mm (LxW typ), IPC High Density)
footprint C0805 (Chip Capacitor; Body 2.0x1.3mm (LxW typ), IPC High Density)
footprint C1206 (Chip Capacitor; Body 3.2x1.6mm (LxW typ), IPC High Density)
footprint C1210 (Chip Capacitor; Body 3.2x2.5mm (LxW typ), IPC High Density)
footprint C1812 (Chip Capacitor; Body 4.5x3.2mm (LxW typ), IPC High Density)
footprint C1825 (Chip Capacitor; Body 4.5x6.4mm (LxW typ), IPC High Density)
footprint C0402 (Chip Capacitor; Body 1.0x0.5mm (LxW typ), IPC High Density)
signal-integrity model Cap
simulation model CAP
footprint C0402 RevOne
pins: 1, 2
2 alternate drawings of the same symbol

## CAP_8
designator C?, comment value 22uF  (hidden comment: C)